# Altium footprint library PcbLib1.PcbLib: 150 footprints (part 7 of 10)
Each footprint in its own frame and in the unit in brackets; x right, y up, seen from the top. Pads: shape width x height; smd on the part's side, far side on the other; paste and mask are expansions set on the pad; w line width, h text height; cw(c..) or ccw(c..) is an arc to the next point about the centre after c.
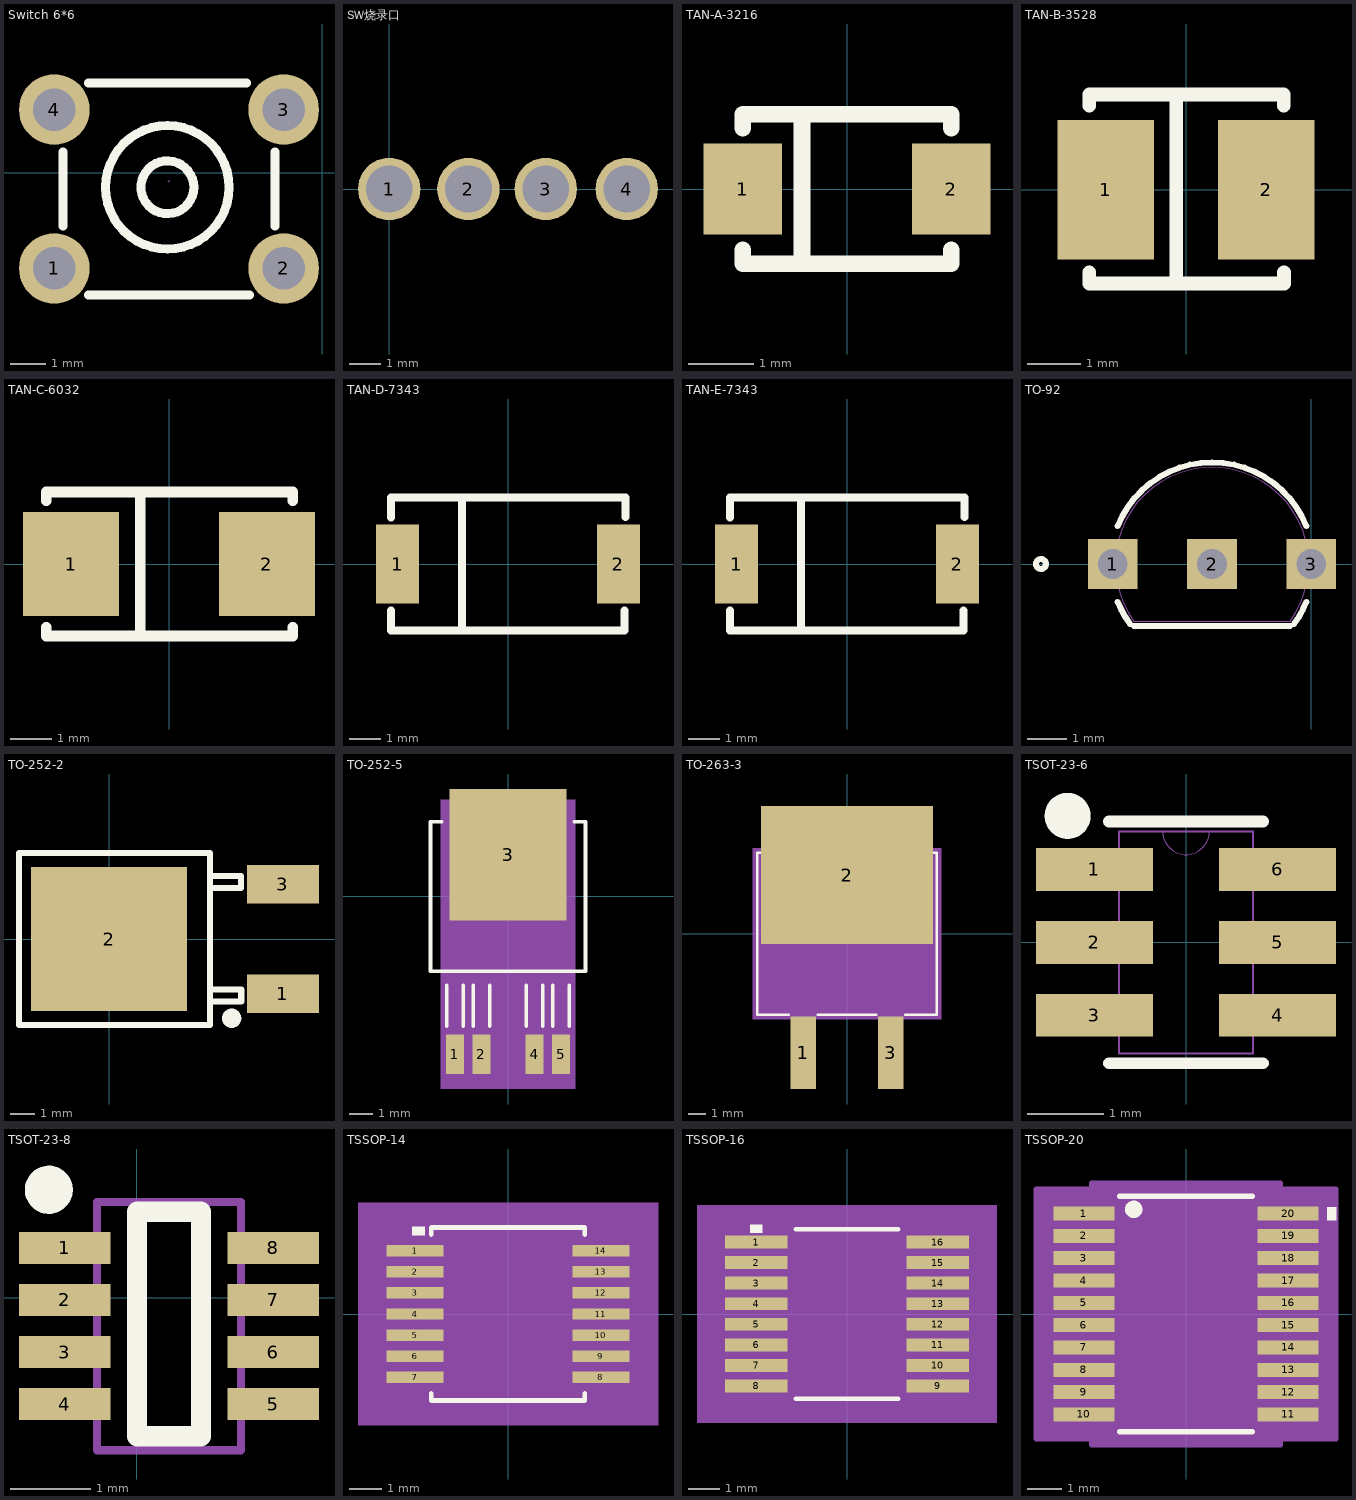
[diagram p6: the footprints below, top view; thin cyan lines are the x and y axes]

## Switch 6*6 [mm]
pads (4):
  round 2 hole 1.2: 1(-7.585,-2.708) 2(-1.085,-2.708) 3(-1.085,1.791) 4(-7.585,1.791)
Top Overlay:
  circle w0.254: c-4.381,-0.41 r0.749
  circle w0.254: c-4.381,-0.41 r1.75
  lines w0.254: -7.335,-1.503 -7.335,0.586 ; -6.61,-3.458 -2.061,-3.458 ; -6.61,2.542 -2.135,2.542 ; -1.335,-1.503 -1.335,0.586
Mechanical 15:
  lines w0.003: -4.361,-0.257 -4.31,-0.206

## SW烧录口 [mm]
pads (4):
  round 2 hole 1.5: 1(0,0) 2(2.54,0) 3(5.02,0) 4(7.62,0)

## TAN-A-3216 [mm]
pads (2):
  rect 1.2x1.4 smd: 1(-1.6,0) 2(1.6,0)
Top Overlay:
  lines w0.254: -1.6,-0.931 -1.6,-1.143 -0.128,-1.143 1.6,-1.143 1.6,-0.931 ; -1.6,0.931 -1.6,1.143 1.6,1.143 1.6,0.931 ; -0.69,-1.143 -0.69,1.143
3D body "User Library-AVX_ACASE.STEP": height 1.71, standoff 0, extent -1.649,-0.814 1.751,0.866

## TAN-B-3528 [mm]
pads (2):
  rect 1.8x2.6 smd: 1(-1.501,0) 2(1.501,0)
Top Overlay:
  lines w0.254: -1.803,-1.541 -1.803,-1.753 0.102,-1.753 1.83,-1.753 1.83,-1.541 ; -1.803,1.566 -1.803,1.778 1.827,1.778 1.827,1.566 ; -0.18,-1.753 -0.18,1.753
3D body "User Library-AVX_BCASE.STEP": height 2.03, standoff 0, extent -1.875,-1.465 1.825,1.465

## TAN-C-6032 [mm]
pads (2):
  rect 2.3x2.5 smd: 1(-2.35,0) 2(2.35,0)
Top Overlay:
  lines w0.254: -2.944,-1.515 -2.944,-1.727 -0.686,-1.727 ; -2.944,1.515 -2.944,1.727 2.972,1.727 2.972,1.515 ; -0.686,1.676 -0.686,-1.727 ; 2.972,-1.515 2.972,-1.727 -0.686,-1.727
3D body "User Library-AVX_C_CASE.STEP": height 2.7, standoff 0, extent -3.05,-1.675 3.05,1.675

## TAN-D-7343 [mm]
pads (2):
  rect 1.36x2.5 smd: 1(-3.492,0) 2(3.492,0)
Top Overlay:
  lines w0.254: -3.706,-1.465 -3.706,-2.108 -1.448,-2.108 ; -3.706,1.473 -3.706,2.108 3.708,2.108 3.708,1.49 ; -1.448,2.083 -1.448,-2.108 ; 3.683,-1.465 3.683,-2.108 -1.448,-2.108
3D body "User Library-AVX_D_CASE.STEP": height 3.01, standoff 0, extent -3.7,-2.225 3.7,2.225

## TAN-E-7343 [mm]
pads (2):
  rect 1.36x2.5 smd: 1(-3.492,0) 2(3.492,0)
Top Overlay:
  lines w0.254: -3.706,-1.465 -3.706,-2.108 -1.448,-2.108 ; -3.706,1.473 -3.706,2.108 3.708,2.108 3.708,1.49 ; -1.448,2.083 -1.448,-2.108 ; 3.683,-1.465 3.683,-2.108 -1.448,-2.108
3D body "User Library-AVX_E_CASE.STEP": height 4.2, standoff 0, extent -3.7,-2.225 3.7,2.225

## TO-92 [mil]
pads (3):
  rect 50x50 hole 30 mask+0: 1(-200,0) 2(-100,0) 3(0,0)
Top Overlay:
  circle w6: c-272.5,0 r5
  lines w6: -195.16,-38.1 ccw(c-100,0) -182.78,-60.45 ; -195.16,38.1 cw(c-100,0) -4.84,38.1 ; -178.74,-62.5 -21.26,-62.5 ; -17.22,-60.45 ccw(c-100,0) -4.84,-38.1
Mechanical 13:
  circle w0: c-187.5,0 r5
  lines w0: -178.74,-57.5 cw(c-100,0) -21.26,-57.5
  lines w1: -178.74,-57.5 -21.26,-57.5
  lines w6: -210,0 -190,0 ; -200,-10 -200,10
3D body: height 10, standoff 0, extent 0,0 10,10
3D body "TO-92.step": height 273.74, standoff -101.26, extent -209,-42.98 11,92

## TO-252-2 [mm]
pads (3):
  rect 3x1.6 smd: 1(7.234,-2.285) 3(7.228,2.285)
  rect 6.5x6 smd: 2(0,0)
Top Overlay:
  lines w0.254: 4.195,2.122 5.495,2.122 5.495,2.623 4.195,2.623 ; 4.199,-2.6 5.499,-2.6 5.499,-2.1 4.199,-2.1 ; -3.751,-3.573 -3.751,3.573 4.199,3.573 4.199,-3.573 -3.751,-3.573
  lines w0.4: 5.099,-3.099 ccw(c5.1,-3.299) 5.102,-3.099
Mechanical 15:
  lines w0.003: 2.403,0.14 2.453,0.191
3D body "User Library-DPAK_TO-252AA.STEP": height 2.37, standoff -0.03, extent -2.173,-3.468 7.927,3.265

## TO-252-5 [mil]
pads (5):
  rect 30x67 smd: 1(-89.76,-267) 2(-44.88,-267) 4(44.88,-267) 5(89.76,-267)
  rect 197x222 smd: 3(0,70.5)
Top Overlay:
  lines w6: -111.6,126.5 -131,126.5 -131,-126.5 131,-126.5 131,126.5 111.6,126.5 ; -103.76,-219.5 -103.76,-150.5 ; -75.76,-219.5 -75.76,-150.5 ; -58.88,-219.5 -58.88,-150.5 ; -30.88,-219.5 -30.88,-150.5 ; 30.88,-219.5 30.88,-150.5 ; 58.88,-219.5 58.88,-150.5 ; 75.76,-219.5 75.76,-150.5 ; 103.76,-219.5 103.76,-150.5
Mechanical 5:
  region: -113.5,163.5 113.5,163.5 113.5,-325.5 -113.5,-325.5
Mechanical 13:
  lines w1: -14,-126.5 14,-126.5 ; -131,-126.5 -131,126.5 131,126.5 131,-126.5 -131,-126.5 ; -103.76,-286.5 -75.76,-286.5 -75.76,-126.5 -103.76,-126.5 -103.76,-286.5 ; -58.88,-286.5 -30.88,-286.5 -30.88,-126.5 -58.88,-126.5 -58.88,-286.5 ; 30.88,-286.5 58.88,-286.5 58.88,-126.5 30.88,-126.5 30.88,-286.5 ; 75.76,-286.5 103.76,-286.5 103.76,-126.5 75.76,-126.5 75.76,-286.5
3D body: height 10, standoff 0, extent 0,0 10,10
3D body "User Library-PG-TO252-5-11-1.STEP": height 91.55, standoff 1, extent -129.95,-254.34 125.96,135.42

## TO-263-3 [mm]
pads (3):
  rect 1.5x4.2 smd paste+0 mask+0: 1(-2.54,-6.9) 3(2.54,-6.9)
  rect 10x8 smd paste+0 mask+0: 2(0,3.4)
Top Overlay:
  lines w0.152: -4.613,4.699 -5.207,4.699 -5.207,-4.699 -3.393,-4.699 ; -1.687,-4.699 1.687,-4.699 ; 3.393,-4.699 5.207,-4.699 5.207,4.699 4.613,4.699
Mechanical 5:
  region: -5.461,4.953 5.461,4.953 5.461,-4.953 -5.461,-4.953
Mechanical 13:
  lines w0.025: -5.08,-4.572 -5.08,4.572 5.08,4.572 5.08,-4.572 -5.08,-4.572
Mechanical 15:
  region: 5.334,-4.826 -5.334,-4.826 -5.334,4.826 5.334,4.826
  lines w0.152: -5.334,-4.826 5.334,-4.826 5.334,4.826 -5.334,4.826 -5.334,-4.826
3D body "User Library-TO263-3S.STEP": height 4.83, standoff 0.03, extent -5,-8.749 5,6.921
3D body: height 0.25, standoff 0, extent 0,0 0.254,0.254

## TSOT-23-6 [mil]
pads (6):
  rect 60x22 smd: 1(-47,37.4) 2(-47,0) 3(-47,-37.4) 4(47,-37.4) 5(47,0) 6(47,37.4)
Top Overlay:
  lines w6: -39.5,-62 39.5,-62 ; -39.5,62 39.5,62
  lines w11.81: -60.83,70.81 ccw(c-60.78,64.91) -60.73,70.81
Mechanical 13:
  lines w0: -12,57 ccw(c0,57) 12,57
  lines w1: -55,-46.4 -34.5,-46.4 -34.5,-28.4 -55,-28.4 -55,-46.4 ; -55,-9 -34.5,-9 -34.5,9 -55,9 -55,-9 ; -55,28.4 -34.5,28.4 -34.5,46.4 -55,46.4 -55,28.4 ; -34.5,-57 -34.5,57 34.5,57 34.5,-57 -34.5,-57 ; 34.5,-46.4 55,-46.4 55,-28.4 34.5,-28.4 34.5,-46.4 ; 34.5,-9 55,-9 55,9 34.5,9 34.5,-9 ; 34.5,28.4 55,28.4 55,46.4 34.5,46.4 34.5,28.4
3D body "User Library-TSOT-23.STEP": height 33.76, standoff 0, extent -55.31,-59.06 55.3,59.05
3D body: height 10, standoff 0, extent -5,-5 5,5

## TSOT-23-8 [mm]
pads (8):
  rect 1.143x0.4 smd mask+0.051: 1(-0.9,0.625) 2(-0.9,-0.025) 3(-0.9,-0.675) 4(-0.9,-1.325) 5(1.7,-1.325) 6(1.7,-0.675) 7(1.7,-0.025) 8(1.7,0.625)
Top Overlay:
  circle w0.3: c-1.1,1.35 r0.15
  lines w0.254: 0,-1.725 0.8,-1.725 0.8,1.075 0,1.075 0,-1.725
Mechanical 13:
  lines w0.1: -0.5,-1.9 -0.5,1.2 1.3,1.2 1.3,-1.9 -0.5,-1.9
3D body "User Library-TSOT-23-8-1.STEP": height 1, standoff 0, extent -1.044,-1.806 1.756,1.094

## TSSOP-14 [mm]
pads (14):
  rect 1.762x0.355 smd paste+0 mask+0: 1(-2.869,1.95) 2(-2.869,1.3) 3(-2.869,0.65) 4(-2.869,0) 5(-2.869,-0.65) 6(-2.869,-1.3) 7(-2.869,-1.95) 8(2.869,-1.95) 9(2.869,-1.3) 10(2.869,-0.65) 11(2.869,0) 12(2.869,0.65) 13(2.869,1.3) 14(2.869,1.95)
Top Overlay:
  region: -2.959,2.438 -2.959,2.692 -2.578,2.692 -2.578,2.438
  lines w0.152: -2.375,-2.46 -2.375,-2.68 2.375,-2.68 2.375,-2.46 ; -2.375,2.46 -2.375,2.68 2.375,2.68 2.375,2.46
Mechanical 5:
  region: 4.639,-3.442 -4.639,-3.442 -4.639,3.442 4.639,3.442
Mechanical 13:
  lines w0: -0.305,2.553 ccw(c0,2.553) 0.305,2.553
  lines w0.025: -3.2,-2.102 -3.2,-1.798 -2.248,-1.798 -2.248,-2.102 -3.2,-2.102 ; -3.2,-1.452 -3.2,-1.148 -2.248,-1.148 -2.248,-1.452 -3.2,-1.452 ; -3.2,-0.802 -3.2,-0.498 -2.248,-0.498 -2.248,-0.802 -3.2,-0.802 ; -3.2,-0.152 -3.2,0.152 -2.248,0.152 -2.248,-0.152 -3.2,-0.152 ; -3.2,0.498 -3.2,0.802 -2.248,0.802 -2.248,0.498 -3.2,0.498 ; -3.2,1.148 -3.2,1.452 -2.248,1.452 -2.248,1.148 -3.2,1.148 ; -3.2,1.798 -3.2,2.102 -2.248,2.102 -2.248,1.798 -3.2,1.798 ; -2.248,-2.553 2.248,-2.553 2.248,2.553 -2.248,2.553 -2.248,-2.553 ; 2.248,-2.102 2.248,-1.798 3.2,-1.798 3.2,-2.102 2.248,-2.102 ; 2.248,-1.452 2.248,-1.148 3.2,-1.148 3.2,-1.452 2.248,-1.452 ; 2.248,-0.802 2.248,-0.498 3.2,-0.498 3.2,-0.802 2.248,-0.802 ; 2.248,-0.152 2.248,0.152 3.2,0.152 3.2,-0.152 2.248,-0.152 ; 2.248,0.498 2.248,0.802 3.2,0.802 3.2,0.498 2.248,0.498 ; 2.248,1.148 2.248,1.452 3.2,1.452 3.2,1.148 2.248,1.148 ; 2.248,1.798 2.248,2.102 3.2,2.102 3.2,1.798 2.248,1.798
  text "*" at -2.184,1.206 h1.27
Mechanical 15:
  region: -2.756,-2.635 -4.258,-2.635 -4.258,2.635 -2.756,2.635 -2.756,3.061 2.756,3.061 2.756,2.635 4.258,2.635 4.258,-2.635 2.756,-2.635 2.756,-3.061 -2.756,-3.061
  lines w0.152: -4.258,-2.635 -4.258,2.635 -2.756,2.635 -2.756,3.061 2.756,3.061 2.756,2.635 4.258,2.635 4.258,-2.635 2.756,-2.635 2.756,-3.061 -2.756,-3.061 -2.756,-2.635 -4.258,-2.635
3D body "TSSOP14_MC_MCH-L.step": height 1.2, standoff 0, extent -3.2,-2.553 3.2,2.553
3D body: height 0.25, standoff 0, extent 0,0 0.254,0.254

## TSSOP-16 [mm]
pads (16):
  rect 1.965x0.405 smd paste+0 mask+0: 1(-2.869,2.275) 2(-2.869,1.625) 3(-2.869,0.975) 4(-2.869,0.325) 5(-2.869,-0.325) 6(-2.869,-0.975) 7(-2.869,-1.625) 8(-2.869,-2.275) 9(2.869,-2.275) 10(2.869,-1.625) 11(2.869,-0.975) 12(2.869,-0.325) 13(2.869,0.325) 14(2.869,0.975) 15(2.869,1.625) 16(2.869,2.275)
Top Overlay:
  region: -3.061,2.565 -3.061,2.819 -2.68,2.819 -2.68,2.565
  lines w0.152: -1.623,-2.68 1.623,-2.68 ; -1.623,2.68 1.623,2.68
Mechanical 5:
  region: 4.741,-3.442 -4.741,-3.442 -4.741,3.442 4.741,3.442
Mechanical 13:
  lines w0: -0.305,2.553 ccw(c0,2.553) 0.305,2.553
  lines w0.025: -3.302,-2.427 -3.302,-2.123 -2.248,-2.123 -2.248,-2.427 -3.302,-2.427 ; -3.302,-1.777 -3.302,-1.473 -2.248,-1.473 -2.248,-1.777 -3.302,-1.777 ; -3.302,-1.127 -3.302,-0.823 -2.248,-0.823 -2.248,-1.127 -3.302,-1.127 ; -3.302,-0.477 -3.302,-0.173 -2.248,-0.173 -2.248,-0.477 -3.302,-0.477 ; -3.302,0.173 -3.302,0.477 -2.248,0.477 -2.248,0.173 -3.302,0.173 ; -3.302,0.823 -3.302,1.127 -2.248,1.127 -2.248,0.823 -3.302,0.823 ; -3.302,1.473 -3.302,1.777 -2.248,1.777 -2.248,1.473 -3.302,1.473 ; -3.302,2.123 -3.302,2.427 -2.248,2.427 -2.248,2.123 -3.302,2.123 ; -2.248,-2.553 2.248,-2.553 2.248,2.553 -2.248,2.553 -2.248,-2.553 ; 2.248,-2.427 2.248,-2.123 3.302,-2.123 3.302,-2.427 2.248,-2.427 ; 2.248,-1.777 2.248,-1.473 3.302,-1.473 3.302,-1.777 2.248,-1.777 ; 2.248,-1.127 2.248,-0.823 3.302,-0.823 3.302,-1.127 2.248,-1.127 ; 2.248,-0.477 2.248,-0.173 3.302,-0.173 3.302,-0.477 2.248,-0.477 ; 2.248,0.173 2.248,0.477 3.302,0.477 3.302,0.173 2.248,0.173 ; 2.248,0.823 2.248,1.127 3.302,1.127 3.302,0.823 2.248,0.823 ; 2.248,1.473 2.248,1.777 3.302,1.777 3.302,1.473 2.248,1.473 ; 2.248,2.123 2.248,2.427 3.302,2.427 3.302,2.123 2.248,2.123
  text "*" at -2.184,1.206 h1.27
Mechanical 15:
  region: -2.756,-2.985 -4.36,-2.985 -4.36,2.985 -2.756,2.985 -2.756,3.061 2.756,3.061 2.756,2.985 4.36,2.985 4.36,-2.985 2.756,-2.985 2.756,-3.061 -2.756,-3.061
  lines w0.152: -4.36,-2.985 -4.36,2.985 -2.756,2.985 -2.756,3.061 2.756,3.061 2.756,2.985 4.36,2.985 4.36,-2.985 2.756,-2.985 2.756,-3.061 -2.756,-3.061 -2.756,-2.985 -4.36,-2.985
3D body: height 0.25, standoff 0, extent 0,0 0.254,0.254
3D body "PW16-M.step": height 1.2, standoff 0, extent -3.302,-2.553 3.302,2.553

## TSSOP-20 [mil]
pads (20):
  rect 70x16 smd: 1(-117,115.16) 2(-117,89.57) 3(-117,63.98) 4(-117,38.39) 5(-117,12.8) 6(-117,-12.8) 7(-117,-38.39) 8(-117,-63.98) 9(-117,-89.57) 10(-117,-115.16) 11(117,-115.16) 12(117,-89.57) 13(117,-63.98) 14(117,-38.39) 15(117,-12.8) 16(117,12.8) 17(117,38.39) 18(117,63.98) 19(117,89.57) 20(117,115.16)
Top Overlay:
  circle w10: c-60,120 r5
  region: 162,122.66 172,122.66 172,107.66 162,107.66
  lines w6: -76.4,-135 76.4,-135 ; -76.4,135 76.4,135
Mechanical 13:
  lines w0: -12,130 ccw(c0,130) 12,130
  lines w1: -130,-121.16 -88,-121.16 -88,-109.16 -130,-109.16 -130,-121.16 ; -130,-95.57 -88,-95.57 -88,-83.57 -130,-83.57 -130,-95.57 ; -130,-69.98 -88,-69.98 -88,-57.98 -130,-57.98 -130,-69.98 ; -130,-44.39 -88,-44.39 -88,-32.39 -130,-32.39 -130,-44.39 ; -130,-18.8 -88,-18.8 -88,-6.8 -130,-6.8 -130,-18.8 ; -130,6.8 -88,6.8 -88,18.8 -130,18.8 -130,6.8 ; -130,32.39 -88,32.39 -88,44.39 -130,44.39 -130,32.39 ; -130,57.98 -88,57.98 -88,69.98 -130,69.98 -130,57.98 ; -130,83.57 -88,83.57 -88,95.57 -130,95.57 -130,83.57 ; -130,109.16 -88,109.16 -88,121.16 -130,121.16 -130,109.16 ; -88,-130 -88,130 88,130 88,-130 -88,-130 ; 88,-121.16 130,-121.16 130,-109.16 88,-109.16 88,-121.16 ; 88,-95.57 130,-95.57 130,-83.57 88,-83.57 88,-95.57 ; 88,-69.98 130,-69.98 130,-57.98 88,-57.98 88,-69.98 ; 88,-44.39 130,-44.39 130,-32.39 88,-32.39 88,-44.39 ; 88,-18.8 130,-18.8 130,-6.8 88,-6.8 88,-18.8 ; 88,6.8 130,6.8 130,18.8 88,18.8 88,6.8 ; 88,32.39 130,32.39 130,44.39 88,44.39 88,32.39 ; 88,57.98 130,57.98 130,69.98 88,69.98 88,57.98 ; 88,83.57 130,83.57 130,95.57 88,95.57 88,83.57 ; 88,109.16 130,109.16 130,121.16 88,121.16 88,109.16
Mechanical 15:
  region: -108,-143.16 -172,-143.16 -172,143.16 -108,143.16 -108,150 108,150 108,143.16 172,143.16 172,-143.16 108,-143.16 108,-150 -108,-150
  lines w6: -172,-143.16 -108,-143.16 -108,-150 108,-150 108,-143.16 172,-143.16 172,143.16 108,143.16 108,150 -108,150 -108,143.16 -172,143.16 -172,-143.16
3D body: height 10, standoff 0, extent 0,0 10,10
3D body "User Library-tssop-20-1.STEP": height 47.24, standoff 0, extent -129.92,-129.92 129.92,129.92